# Altium footprint library AOO.PcbLib: 131 footprints (part 1 of 9)
Each footprint in its own frame and in the unit in brackets; x right, y up, seen from the top. Pads: shape width x height; smd on the part's side, far side on the other; paste and mask are expansions set on the pad; w line width, h text height; cw(c..) or ccw(c..) is an arc to the next point about the centre after c.
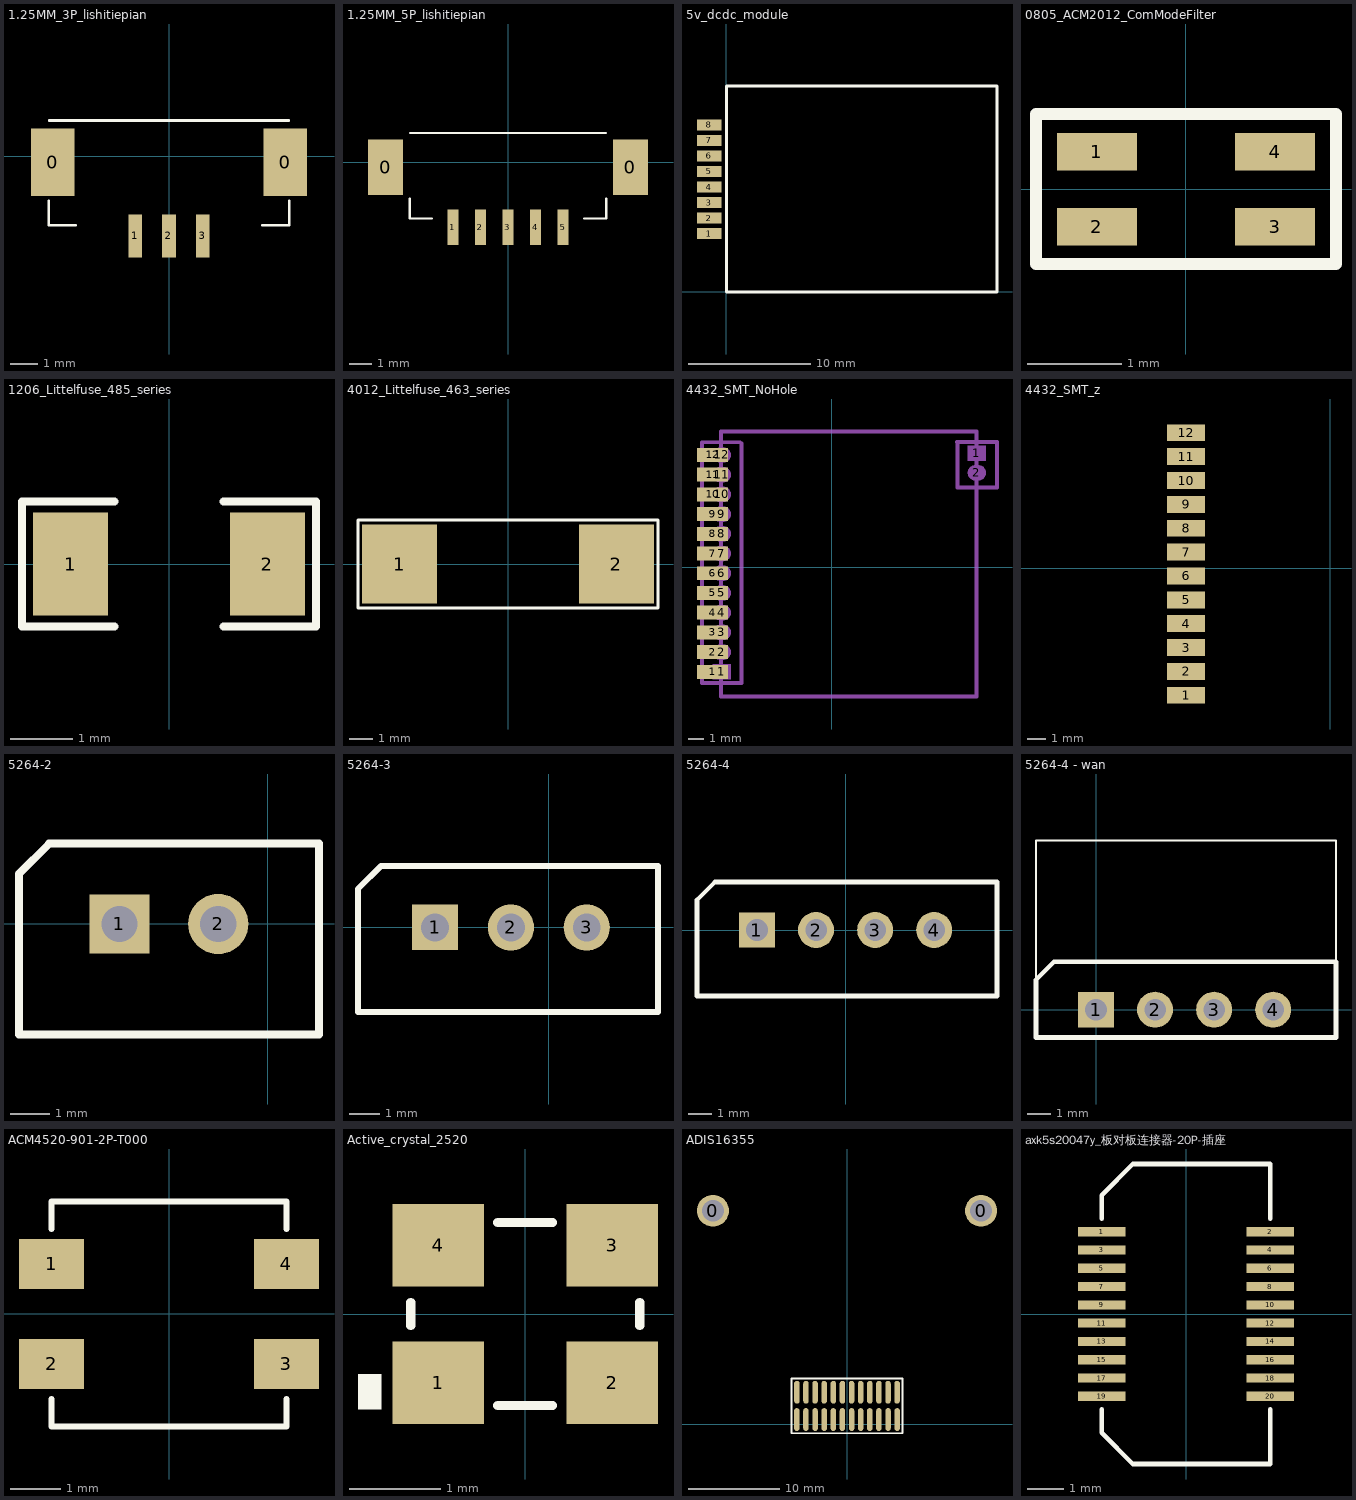
[diagram p0: the footprints below, top view; thin cyan lines are the x and y axes]

## 1.25MM_3P_lishitiepian [mm]
pads (5):
  rect 1.6x2.5 smd: 0(-4.3,-0.225) 0(4.3,-0.225)
  rect 0.5x1.6 smd: 1(-1.25,-2.95) 2(0,-2.95) 3(1.25,-2.95)
Top Overlay:
  lines w0.1: -4.45,-1.645 -4.45,-2.55 -3.45,-2.55 ; -4.435,1.325 4.435,1.325 ; 3.45,-2.55 4.45,-2.55 4.45,-1.645
3D body: height 4.85, standoff 0.02, extent -4.435,-3.005 4.435,1.275

## 1.25MM_5P_lishitiepian [mm]
pads (7):
  rect 1.6x2.5 smd: 0(-5.55,-0.225) 0(5.55,-0.225)
  rect 0.5x1.6 smd: 1(-2.5,-2.95) 2(-1.25,-2.95) 3(0,-2.95) 4(1.25,-2.95) 5(2.5,-2.95)
Top Overlay:
  lines w0.1: -4.45,-1.645 -4.45,-2.55 -3.45,-2.55 ; -4.435,1.325 4.435,1.325 ; 3.45,-2.55 4.45,-2.55 4.45,-1.645
3D body: height 4.85, standoff 0.02, extent -5.685,-3.005 5.685,1.275

## 5v_dcdc_module [mm]
pads (8):
  rect 2x0.9 smd: 1(-1.4,4.75) 2(-1.4,6.02) 3(-1.4,7.29) 4(-1.4,8.56) 5(-1.4,9.83) 6(-1.4,11.1) 7(-1.4,12.37) 8(-1.4,13.64)
Top Overlay:
  lines w0.254: 0,0 0,16.8 22.1,16.8 22.1,0 0,0

## 0805_ACM2012_ComModeFilter [mm] "TBU_P500-G120"
pads (4):
  rect 0.85x0.4 smd: 1(-0.95,0.4) 2(-0.95,-0.4) 3(0.95,-0.4) 4(0.95,0.4)
Top Overlay:
  lines w0.127: -1.6,-0.8 1.6,-0.8 1.6,0.8 -1.6,0.8 -1.6,-0.8
3D body: height 1.33, standoff 0.02, extent -1.01,-0.6 1.01,0.6

## 1206_Littelfuse_485_series [mm] "1206_Littelfuse_485_series"
pads (2):
  rect 1.2x1.65 smd: 1(-1.575,0) 2(1.575,0)
Top Overlay:
  lines w0.127: -0.875,-1 -2.35,-1 -2.35,1 -0.875,1 ; 0.875,-1 2.35,-1 2.35,1 0.875,1
3D body: height 1.74, standoff 0.02, extent -1.588,-0.788 1.587,0.788

## 4012_Littelfuse_463_series [mm] "4012_Littelfuse_463_series"
pads (2):
  rect 3.25x3.43 smd: 1(-4.7,0) 2(4.7,0)
Top Overlay:
  lines w0.127: -6.5,-1.9 -6.5,1.9 6.5,1.9 6.5,-1.9 -6.5,-1.9
3D body: height 3.34, standoff 0.02, extent -5.05,-1.61 5.05,1.61

## 4432_SMT_NoHole [mm]
pads (26):
  rect 2x0.9 smd: 1(-7.687,-6.752) 2(-7.687,-5.482) 3(-7.687,-4.212) 4(-7.687,-2.942) 5(-7.687,-1.672) 6(-7.687,-0.402) 7(-7.687,0.868) 8(-7.687,2.138) 9(-7.687,3.408) 10(-7.687,4.678) 11(-7.687,5.95) 12(-7.687,7.22)
  rect 1.2x1 on Mech13: 1(-7.087,-6.752) 1(9.352,7.342)
  oval 1.2x1 on Mech13: 2(-7.087,-5.482) 2(9.352,6.072) 3(-7.087,-4.212) 4(-7.087,-2.942) 5(-7.087,-1.672) 6(-7.087,-0.402) 7(-7.087,0.868) 8(-7.087,2.138) 9(-7.087,3.408) 10(-7.087,4.678) 11(-7.087,5.95) 12(-7.087,7.22)
Mechanical 13:
  lines w0.254: -8.357,-1.232 -8.357,2.888 ; -8.357,-1.136 -8.357,5.364 ; -8.357,-0.986 -8.357,-7.486 ; -8.357,3.068 -8.357,5.418 ; -8.357,4.327 -8.357,8.039 -8.358,8.04 -5.906,8.04 -5.817,7.951 -5.817,4.988 ; -5.817,-2.232 -5.817,2.888 ; -5.817,-1.138 -5.817,5.362 ; -5.817,-0.988 -5.817,-7.488 ; -5.817,5.418 -5.817,-7.488 ; 8.082,8.053 10.642,8.053 ; 8.107,8.053 8.107,5.132 10.647,5.132 10.647,8.053 ; -8.357,-7.486 -8.357,5.418 ; -8.357,-7.486 -8.355,-7.488 -5.817,-7.488 ; -8.357,5.418 -8.357,5.418 ; -5.817,2.888 -5.817,2.888 ; -7.127,-8.331 -7.127,8.72 9.322,8.72 9.322,-8.331 -7.127,-8.331
  text "GND" at 12.7,6.096 h0.71
  text "ANT" at 12.7,7.62 h0.71

## 4432_SMT_z [mm]
pads (12):
  rect 2x0.9 smd: 1(-7.687,-6.752) 2(-7.687,-5.482) 3(-7.687,-4.212) 4(-7.687,-2.942) 5(-7.687,-1.672) 6(-7.687,-0.402) 7(-7.687,0.868) 8(-7.687,2.138) 9(-7.687,3.408) 10(-7.687,4.678) 11(-7.687,5.95) 12(-7.687,7.22)
3D body: height 3.51, standoff -1.49, extent -7.8,-8.4 45.8,9.9

## 5264-2 [mil]
pads (2):
  rect 60x59.05 hole 36: 1(-147.64,0)
  round 60 hole 36: 2(-49.21,0)
Top Overlay:
  lines w7.87: -247.64,-110 -247.64,50 -217.64,80 51.18,80 51.18,-110 -247.64,-110

## 5264-3 [mil]
pads (3):
  rect 60x59.05 hole 36: 1(-147.64,0)
  round 60 hole 36: 2(-49.21,0) 3(49.21,0)
Top Overlay:
  lines w7.87: -247.64,-110 -247.64,50 -217.64,80 141.73,80 141.73,-110 -247.64,-110

## 5264-4 [mil]
pads (4):
  rect 60x59.05 hole 36: 1(-147.64,0)
  round 60 hole 36: 2(-49.21,0) 3(49.21,0) 4(147.64,0)
Top Overlay:
  lines w7.87: -247.64,-110 -247.64,50 -217.64,80 252.36,80 252.36,-110 -247.64,-110
3D body: height 246.06, standoff -78.74, extent -244.73,-117.76 247.4,79.09

## 5264-4 - wan [mil]
pads (4):
  rect 60x59.05 hole 36: 1(0,0)
  round 60 hole 36: 2(98.43,0) 3(196.85,0) 4(295.28,0)
Top Overlay:
  lines w3.94: -100,50 -100,281.89 400,281.89 400,80
  lines w7.87: -100,-46.26 -100,50 -70,80 400,80 400,-46.26 -100,-46.26
3D body: height 197.45, standoff -78.14, extent -101.38,-15.75 390.75,283.27

## ACM4520-901-2P-T000 [mm] "TBU_P500-G120"
pads (4):
  rect 1.3x1 smd: 1(-2.35,1) 2(-2.35,-1) 3(2.35,-1) 4(2.35,1)
Top Overlay:
  lines w0.127: -2.35,-1.7 -2.35,-2.25 2.35,-2.25 2.35,-1.7 ; -2.35,1.7 -2.35,2.25 2.35,2.25 2.35,1.7
3D body: height 2.05, standoff 0.01, extent -2.35,-2.25 2.35,2.25

## Active_crystal_2520 [mm] "贴片有源晶振2520"
pads (4):
  rect 1x0.9 smd: 1(-0.95,-0.75) 2(0.95,-0.75) 3(0.95,0.75) 4(-0.95,0.75)
Top Overlay:
  region: -1.571,-0.66 -1.825,-0.66 -1.825,-1.041 -1.571,-1.041
  lines w0.1: -1.25,-0.125 -1.25,0.125 ; -0.3,-1 0.3,-1 ; -0.3,1 0.3,1 ; 1.25,-0.125 1.25,0.125
3D body: height 0.83, standoff 0.01, extent -1.25,-1 1.25,1

## ADIS16355 [mm]
height 1.78
pads (26):
  round 3.5 hole 2.4: 0(-14.7,23.4) 0(14.7,23.4)
  oval 0.6x2.5 smd: 1(5.5,0.5) 2(5.5,3.5) 3(4.5,0.5) 4(4.5,3.5) 5(3.5,0.5) 6(3.5,3.5) 7(2.5,0.5) 8(2.5,3.5) 9(1.5,0.5) 10(1.5,3.5) 11(0.5,0.5) 12(0.5,3.5) 13(-0.5,0.5) 14(-0.5,3.5) 15(-1.5,0.5) 16(-1.5,3.5) 17(-2.5,0.5) 18(-2.5,3.5) 19(-3.5,0.5) 20(-3.5,3.5) 21(-4.5,0.5) 22(-4.5,3.5) 23(-5.5,0.5) 24(-5.5,3.5)
Top Overlay:
  lines w0.2: -6.1,-1 -6.1,5 6.1,5 6.1,-1 -6.1,-1
3D body: height 23.27, standoff 0.02, extent -15.85,-1.74 15.85,34.05

## axk5s20047y_板对板连接器-20P-插座 [mm] "TBU_P500-G120"
pads (20):
  rect 1.3x0.25 smd: 1(-2.3,2.25) 2(2.3,2.25) 3(-2.3,1.75) 4(2.3,1.75) 5(-2.3,1.25) 6(2.3,1.25) 7(-2.3,0.75) 8(2.3,0.75) 9(-2.3,0.25) 10(2.3,0.25) 11(-2.3,-0.25) 12(2.3,-0.25) 13(-2.3,-0.75) 14(2.3,-0.75) 15(-2.3,-1.25) 16(2.3,-1.25) 17(-2.3,-1.75) 18(2.3,-1.75) 19(-2.3,-2.25) 20(2.3,-2.25)
Top Overlay:
  lines w0.127: -2.3,-2.6 -2.3,-3.25 -1.45,-4.1 2.3,-4.1 2.3,-2.6 ; -2.3,2.6 -2.3,3.25 -1.45,4.1 2.3,4.1 2.3,2.6
3D body: height 3.02, standoff -0.02, extent -2.7,-4.1 2.7,4.1